# Altium footprint library SAMTEC THD.PcbLib: 161 footprints (part 1 of 12) (continued)
## SAMTEC_EHF-120-01-F-D-RA [mm] "40 Positions, Pitch 1.27mm, Double Row Throught Mount Right Angle Shrouded & Ejector IDC Header"
height 8.26
pads (40):
  rrect50% 1.05x1.05 hole 0.7: 1(-12.065,-0.635) 2(-12.065,0.635) 3(-10.795,-0.635) 4(-10.795,0.635) 5(-9.525,-0.635) 6(-9.525,0.635) 7(-8.255,-0.635) 8(-8.255,0.635) 9(-6.985,-0.635) 10(-6.985,0.635) 11(-5.715,-0.635) 12(-5.715,0.635) 13(-4.445,-0.635) 14(-4.445,0.635) 15(-3.175,-0.635) 16(-3.175,0.635) 17(-1.905,-0.635) 18(-1.905,0.635) 19(-0.635,-0.635) 20(-0.635,0.635) 21(0.635,-0.635) 22(0.635,0.635) 23(1.905,-0.635) 24(1.905,0.635) 25(3.175,-0.635) 26(3.175,0.635) 27(4.445,-0.635) 28(4.445,0.635) 29(5.715,-0.635) 30(5.715,0.635) 31(6.985,-0.635) 32(6.985,0.635) 33(8.255,-0.635) 34(8.255,0.635) 35(9.525,-0.635) 36(9.525,0.635) 37(10.795,-0.635) 38(10.795,0.635) 39(12.065,-0.635) 40(12.065,0.635)
Top Overlay:
  circle w0.3: c-13.231,-1.27 r0.15
  lines w0.2: -19.276,-7.708 -19.299,-7.749 ccw(c-18.64,-8.13) -19.356,-8.391 -17.773,-12.74 ccw(c-17.104,-12.497) -17.104,-13.208 -15.57,-13.208 -13.941,-11.579 ccw(c-14.3,-11.22) -13.792,-11.22 -13.792,-10.922 ccw(c-14.3,-10.922) -14.3,-10.414 -18.619,-10.414 ; -17.399,-1.905 -17.399,-5.029 -19.939,-5.029 ; -15.262,-10.16 -15.24,-10.414 ; -1.27,-2.286 -1.27,-5.029 1.27,-5.029 1.27,-2.286 ; 15.24,-10.414 15.262,-10.16 ; 17.399,-1.905 17.399,-5.029 19.939,-5.029 ; 18.619,-10.414 14.3,-10.414 ccw(c14.3,-10.922) 13.792,-10.922 13.792,-11.22 ccw(c14.3,-11.22) 13.941,-11.579 15.57,-13.208 17.104,-13.208 ccw(c17.104,-12.497) 17.773,-12.74 19.356,-8.391 ccw(c18.64,-8.13) 19.299,-7.749 18.919,-7.09 ; -19.939,-5.029 -19.939,-1.905 -12.827,-1.905 -12.827,-2.286 12.827,-2.286 12.827,-1.905 19.939,-1.905 19.939,-5.029 ; -19.939,-5.029 -18.669,-10.16 -15.24,-10.16 -15.24,-8.128 15.24,-8.128 15.24,-10.16 17.399,-10.16 19.939,-5.029
  text "40" at 13.075,0.229 h1.2
  text "2" at -13.97,0.203 h1.2
Mechanical 8:
  drawing of 164 lines, arcs and shapes, not listed
Mechanical 14:
  circle w0.3: c-13.231,-1.27 r0.15
  lines w0.1: -19.276,-7.708 -19.299,-7.749 ccw(c-18.64,-8.13) -19.356,-8.391 -17.773,-12.74 ccw(c-17.104,-12.497) -17.104,-13.208 -15.57,-13.208 -13.941,-11.579 ccw(c-14.3,-11.22) -13.792,-11.22 -13.792,-10.922 ccw(c-14.3,-10.922) -14.3,-10.414 -18.619,-10.414 ; -17.399,-1.905 -17.399,-5.029 -19.939,-5.029 ; -15.262,-10.16 -15.24,-10.414 ; -12.268,-2.286 -12.268,0.838 -11.862,0.838 -11.862,-2.286 ; -10.998,-2.286 -10.998,0.838 -10.592,0.838 -10.592,-2.286 ; -1.27,-2.286 -1.27,-5.029 1.27,-5.029 1.27,-2.286 ; 10.592,-2.286 10.592,0.838 10.998,0.838 10.998,-2.286 ; 11.862,-2.286 11.862,0.838 12.268,0.838 12.268,-2.286 ; 15.24,-10.414 15.262,-10.16 ; 17.399,-1.905 17.399,-5.029 19.939,-5.029 ; 18.619,-10.414 14.3,-10.414 ccw(c14.3,-10.922) 13.792,-10.922 13.792,-11.22 ccw(c14.3,-11.22) 13.941,-11.579 15.57,-13.208 17.104,-13.208 ccw(c17.104,-12.497) 17.773,-12.74 19.356,-8.391 ccw(c18.64,-8.13) 19.299,-7.749 18.919,-7.09 ; -19.939,-5.029 -19.939,-1.905 -12.827,-1.905 -12.827,-2.286 12.827,-2.286 12.827,-1.905 19.939,-1.905 19.939,-5.029 ; -19.939,-5.029 -18.669,-10.16 -15.24,-10.16 -15.24,-8.128 15.24,-8.128 15.24,-10.16 17.399,-10.16 19.939,-5.029
  text "40" at 13.075,0.229 h1.2
  text "2" at -13.97,0.203 h1.2
3D body "SAMTEC_EHF-120-01-F-D-RA.stp": height 6.68, standoff -2.29, extent -19.939,-13.208 19.939,0.838

## SAMTEC_ESQ-105-12-L-D [mm] "10 Contacts, Pitch 2.54mm - Top Entry, Dual Row, Through Mount Straigh Socket"
height 11.05
pads (10):
  round 1.7 hole 1: 1(-5.08,1.27) 2(-5.08,-1.27) 3(-2.54,1.27) 4(-2.54,-1.27) 5(0,1.27) 6(0,-1.27) 7(2.54,1.27) 8(2.54,-1.27) 9(5.08,1.27) 10(5.08,-1.27)
Top Overlay:
  circle w0.3: c-5.115,3.135 r0.15
  lines w0.2: -6.604,-2.477 -6.604,2.477 6.604,2.477 6.604,-2.477 -6.604,-2.477
  text "1" at -7.427,0.772 h1
Mechanical 8:
  lines w0.1: -5.58,-1.27 -5.08,-1.27 ; -5.58,1.27 -5.08,1.27 ; -5.08,-1.77 -5.08,-1.27 ; -5.08,-0.77 -5.08,-1.27 ; -5.08,0.77 -5.08,1.27 ; -5.08,1.77 -5.08,1.27 ; -4.58,-1.27 -5.08,-1.27 ; -4.58,1.27 -5.08,1.27 ; -3.04,-1.27 -2.54,-1.27 ; -3.04,1.27 -2.54,1.27 ; -2.54,-1.77 -2.54,-1.27 ; -2.54,-0.77 -2.54,-1.27 ; -2.54,0.77 -2.54,1.27 ; -2.54,1.77 -2.54,1.27 ; -2.04,-1.27 -2.54,-1.27 ; -2.04,1.27 -2.54,1.27 ; -0.5,-1.27 0,-1.27 ; -0.5,0 0,0 ; -0.5,1.27 0,1.27 ; 0,-1.77 0,-1.27 ; 0,-0.77 0,-1.27 ; 0,-0.5 0,0 ; 0,0.5 0,0 ; 0,0.77 0,1.27 ; 0,1.77 0,1.27 ; 0.5,-1.27 0,-1.27 ; 0.5,0 0,0 ; 0.5,1.27 0,1.27 ; 2.04,-1.27 2.54,-1.27 ; 2.04,1.27 2.54,1.27 ; 2.54,-1.77 2.54,-1.27 ; 2.54,-0.77 2.54,-1.27 ; 2.54,0.77 2.54,1.27 ; 2.54,1.77 2.54,1.27 ; 3.04,-1.27 2.54,-1.27 ; 3.04,1.27 2.54,1.27 ; 4.58,-1.27 5.08,-1.27 ; 4.58,1.27 5.08,1.27 ; 5.08,-1.77 5.08,-1.27 ; 5.08,-0.77 5.08,-1.27 ; 5.08,0.77 5.08,1.27 ; 5.08,1.77 5.08,1.27 ; 5.58,-1.27 5.08,-1.27 ; 5.58,1.27 5.08,1.27
Mechanical 14:
  circle w0.3: c-5.115,3.135 r0.15
  lines w0.1: -5.906,-2.095 -5.474,-1.664 ; -5.906,-2.095 -5.906,-0.445 ; -5.906,-2.095 -4.255,-2.095 ; -5.906,-0.445 -5.474,-0.876 ; -5.906,-0.445 -4.255,-0.445 ; -5.906,0.445 -5.474,0.876 ; -5.906,0.445 -5.906,2.095 ; -5.906,0.445 -4.255,0.445 ; -5.906,2.095 -5.474,1.664 ; -5.906,2.095 -4.255,2.095 ; -5.474,-1.664 -5.474,-0.876 ; -5.474,-1.664 -4.686,-1.664 ; -5.474,-0.876 -4.686,-0.876 ; -5.474,0.876 -5.474,1.664 ; -5.474,0.876 -4.686,0.876 ; -5.474,1.664 -4.686,1.664 ; -4.686,-1.664 -4.255,-2.095 ; -4.686,-1.664 -4.686,-0.876 ; -4.686,-0.876 -4.255,-0.445 ; -4.686,0.876 -4.255,0.445 ; -4.686,0.876 -4.686,1.664 ; -4.686,1.664 -4.255,2.095 ; -4.255,-2.095 -4.255,-0.445 ; -4.255,0.445 -4.255,2.095 ; -3.366,-2.095 -2.934,-1.664 ; -3.366,-2.095 -3.366,-0.445 ; -3.366,-2.095 -1.714,-2.095 ; -3.366,-0.445 -2.934,-0.876 ; -3.366,-0.445 -1.714,-0.445 ; -3.366,0.445 -2.934,0.876 ; -3.366,0.445 -3.366,2.095 ; -3.366,0.445 -1.714,0.445 ; -3.366,2.095 -2.934,1.664 ; -3.366,2.095 -1.714,2.095 ; -2.934,-1.664 -2.934,-0.876 ; -2.934,-1.664 -2.146,-1.664 ; -2.934,-0.876 -2.146,-0.876 ; -2.934,0.876 -2.934,1.664 ; -2.934,0.876 -2.146,0.876 ; -2.934,1.664 -2.146,1.664 ; -2.146,-1.664 -1.714,-2.095 ; -2.146,-1.664 -2.146,-0.876 ; -2.146,-0.876 -1.714,-0.445 ; -2.146,0.876 -1.714,0.445 ; -2.146,0.876 -2.146,1.664 ; -2.146,1.664 -1.714,2.095 ; -1.714,-2.095 -1.714,-0.445 ; -1.714,0.445 -1.714,2.095 ; -0.826,-2.095 -0.394,-1.664 ; -0.826,-2.095 -0.826,-0.445 ; -0.826,-2.095 0.826,-2.095 ; -0.826,-0.445 -0.394,-0.876 ; -0.826,-0.445 0.826,-0.445 ; -0.826,0.445 -0.394,0.876 ; -0.826,0.445 -0.826,2.095 ; -0.826,0.445 0.826,0.445 ; -0.826,2.095 -0.394,1.664 ; -0.826,2.095 0.826,2.095 ; -0.394,-1.664 -0.394,-0.876 ; -0.394,-1.664 0.394,-1.664 ; -0.394,-0.876 0.394,-0.876 ; -0.394,0.876 -0.394,1.664 ; -0.394,0.876 0.394,0.876 ; -0.394,1.664 0.394,1.664 ; 0.394,-1.664 0.826,-2.095 ; 0.394,-1.664 0.394,-0.876 ; 0.394,-0.876 0.826,-0.445 ; 0.394,0.876 0.826,0.445 ; 0.394,0.876 0.394,1.664 ; 0.394,1.664 0.826,2.095 ; 0.826,-2.095 0.826,-0.445 ; 0.826,0.445 0.826,2.095 ; 1.714,-2.095 2.146,-1.664 ; 1.714,-2.095 1.714,-0.445 ; 1.714,-2.095 3.366,-2.095 ; 1.714,-0.445 2.146,-0.876 ; 1.714,-0.445 3.366,-0.445 ; 1.714,0.445 2.146,0.876 ; 1.714,0.445 1.714,2.095 ; 1.714,0.445 3.366,0.445 ; 1.714,2.095 2.146,1.664 ; 1.714,2.095 3.366,2.095 ; 2.146,-1.664 2.146,-0.876 ; 2.146,-1.664 2.934,-1.664 ; 2.146,-0.876 2.934,-0.876 ; 2.146,0.876 2.146,1.664 ; 2.146,0.876 2.934,0.876 ; 2.146,1.664 2.934,1.664 ; 2.934,-1.664 3.366,-2.095 ; 2.934,-1.664 2.934,-0.876 ; 2.934,-0.876 3.366,-0.445 ; 2.934,0.876 3.366,0.445 ; 2.934,0.876 2.934,1.664 ; 2.934,1.664 3.366,2.095 ; 3.366,-2.095 3.366,-0.445 ; 3.366,0.445 3.366,2.095 ; 4.255,-2.095 4.686,-1.664 ; 4.255,-2.095 4.255,-0.445 ; 4.255,-2.095 5.906,-2.095 ; 4.255,-0.445 4.686,-0.876 ; 4.255,-0.445 5.906,-0.445 ; 4.255,0.445 4.686,0.876 ; 4.255,0.445 4.255,2.095 ; 4.255,0.445 5.906,0.445 ; 4.255,2.095 4.686,1.664 ; 4.255,2.095 5.906,2.095 ; 4.686,-1.664 4.686,-0.876 ; 4.686,-1.664 5.474,-1.664 ; 4.686,-0.876 5.474,-0.876 ; 4.686,0.876 4.686,1.664 ; 4.686,0.876 5.474,0.876 ; 4.686,1.664 5.474,1.664 ; 5.474,-1.664 5.906,-2.095 ; 5.474,-1.664 5.474,-0.876 ; 5.474,-0.876 5.906,-0.445 ; 5.474,0.876 5.906,0.445 ; 5.474,0.876 5.474,1.664 ; 5.474,1.664 5.906,2.095 ; 5.906,-2.095 5.906,-0.445 ; 5.906,0.445 5.906,2.095 ; -6.604,-2.477 -6.604,2.477 6.604,2.477 6.604,-2.477 -6.604,-2.477
  text "1" at -7.427,0.772 h1
3D body "SAMTEC_ESQ-105-12-L-D.stp": height 11.05, standoff -2.29, extent -6.604,-2.54 6.604,2.54

## SAMTEC_ESQ-110-12-L-D [mm] "20 Contacts, Pitch 2.54mm - Top Entry, Dual Row, Through Mount Straigh Socket"
height 11.05
pads (20):
  round 1.7 hole 1: 1(-11.43,1.27) 2(-11.43,-1.27) 3(-8.89,1.27) 4(-8.89,-1.27) 5(-6.35,1.27) 6(-6.35,-1.27) 7(-3.81,1.27) 8(-3.81,-1.27) 9(-1.27,1.27) 10(-1.27,-1.27) 11(1.27,1.27) 12(1.27,-1.27) 13(3.81,1.27) 14(3.81,-1.27) 15(6.35,1.27) 16(6.35,-1.27) 17(8.89,1.27) 18(8.89,-1.27) 19(11.43,1.27) 20(11.43,-1.27)
Top Overlay:
  circle w0.3: c-11.465,3.135 r0.15
  lines w0.2: -12.954,-2.476 12.954,-2.476 12.954,2.476 -12.954,2.476 -12.954,-2.476
  text "1" at -13.777,0.772 h1
Mechanical 8:
  lines w0.05: -11.93,-1.27 -11.43,-1.27 ; -11.93,1.27 -11.43,1.27 ; -11.43,-1.77 -11.43,-1.27 ; -11.43,-0.77 -11.43,-1.27 ; -11.43,0.77 -11.43,1.27 ; -11.43,1.77 -11.43,1.27 ; -10.93,-1.27 -11.43,-1.27 ; -10.93,1.27 -11.43,1.27 ; -9.39,-1.27 -8.89,-1.27 ; -9.39,1.27 -8.89,1.27 ; -8.89,-1.77 -8.89,-1.27 ; -8.89,-0.77 -8.89,-1.27 ; -8.89,0.77 -8.89,1.27 ; -8.89,1.77 -8.89,1.27 ; -8.39,-1.27 -8.89,-1.27 ; -8.39,1.27 -8.89,1.27 ; -6.85,-1.27 -6.35,-1.27 ; -6.85,1.27 -6.35,1.27 ; -6.35,-1.77 -6.35,-1.27 ; -6.35,-0.77 -6.35,-1.27 ; -6.35,0.77 -6.35,1.27 ; -6.35,1.77 -6.35,1.27 ; -5.85,-1.27 -6.35,-1.27 ; -5.85,1.27 -6.35,1.27 ; -4.31,-1.27 -3.81,-1.27 ; -4.31,1.27 -3.81,1.27 ; -3.81,-1.77 -3.81,-1.27 ; -3.81,-0.77 -3.81,-1.27 ; -3.81,0.77 -3.81,1.27 ; -3.81,1.77 -3.81,1.27 ; -3.31,-1.27 -3.81,-1.27 ; -3.31,1.27 -3.81,1.27 ; -1.77,-1.27 -1.27,-1.27 ; -1.77,1.27 -1.27,1.27 ; -1.27,-1.77 -1.27,-1.27 ; -1.27,-0.77 -1.27,-1.27 ; -1.27,0.77 -1.27,1.27 ; -1.27,1.77 -1.27,1.27 ; -0.77,-1.27 -1.27,-1.27 ; -0.77,1.27 -1.27,1.27 ; -0.5,0 0,0 ; 0,-0.5 0,0 ; 0,0.5 0,0 ; 0.5,0 0,0 ; 0.77,-1.27 1.27,-1.27 ; 0.77,1.27 1.27,1.27 ; 1.27,-1.77 1.27,-1.27 ; 1.27,-0.77 1.27,-1.27 ; 1.27,0.77 1.27,1.27 ; 1.27,1.77 1.27,1.27 ; 1.77,-1.27 1.27,-1.27 ; 1.77,1.27 1.27,1.27 ; 3.31,-1.27 3.81,-1.27 ; 3.31,1.27 3.81,1.27 ; 3.81,-1.77 3.81,-1.27 ; 3.81,-0.77 3.81,-1.27 ; 3.81,0.77 3.81,1.27 ; 3.81,1.77 3.81,1.27 ; 4.31,-1.27 3.81,-1.27 ; 4.31,1.27 3.81,1.27 ; 5.85,-1.27 6.35,-1.27 ; 5.85,1.27 6.35,1.27 ; 6.35,-1.77 6.35,-1.27 ; 6.35,-0.77 6.35,-1.27 ; 6.35,0.77 6.35,1.27 ; 6.35,1.77 6.35,1.27 ; 6.85,-1.27 6.35,-1.27 ; 6.85,1.27 6.35,1.27 ; 8.39,-1.27 8.89,-1.27 ; 8.39,1.27 8.89,1.27 ; 8.89,-1.77 8.89,-1.27 ; 8.89,-0.77 8.89,-1.27 ; 8.89,0.77 8.89,1.27 ; 8.89,1.77 8.89,1.27 ; 9.39,-1.27 8.89,-1.27 ; 9.39,1.27 8.89,1.27 ; 10.93,-1.27 11.43,-1.27 ; 10.93,1.27 11.43,1.27 ; 11.43,-1.77 11.43,-1.27 ; 11.43,-0.77 11.43,-1.27 ; 11.43,0.77 11.43,1.27 ; 11.43,1.77 11.43,1.27 ; 11.93,-1.27 11.43,-1.27 ; 11.93,1.27 11.43,1.27
Mechanical 14:
  circle w0.3: c-11.465,3.135 r0.15
  lines w0.1: -12.954,-2.476 12.954,-2.476 12.954,2.476 -12.954,2.476 -12.954,-2.476 ; -11.811,-1.651 -11.811,-0.889 -11.049,-0.889 -11.049,-1.651 -11.811,-1.651 ; -11.811,0.889 -11.811,1.651 -11.049,1.651 -11.049,0.889 -11.811,0.889 ; -9.271,-1.651 -9.271,-0.889 -8.509,-0.889 -8.509,-1.651 -9.271,-1.651 ; -9.271,0.889 -9.271,1.651 -8.509,1.651 -8.509,0.889 -9.271,0.889 ; -6.731,-1.651 -6.731,-0.889 -5.969,-0.889 -5.969,-1.651 -6.731,-1.651 ; -6.731,0.889 -6.731,1.651 -5.969,1.651 -5.969,0.889 -6.731,0.889 ; -4.191,-1.651 -4.191,-0.889 -3.429,-0.889 -3.429,-1.651 -4.191,-1.651 ; -4.191,0.889 -4.191,1.651 -3.429,1.651 -3.429,0.889 -4.191,0.889 ; -1.651,-1.651 -1.651,-0.889 -0.889,-0.889 -0.889,-1.651 -1.651,-1.651 ; -1.651,0.889 -1.651,1.651 -0.889,1.651 -0.889,0.889 -1.651,0.889 ; 0.889,-1.651 0.889,-0.889 1.651,-0.889 1.651,-1.651 0.889,-1.651 ; 0.889,0.889 0.889,1.651 1.651,1.651 1.651,0.889 0.889,0.889 ; 3.429,-1.651 3.429,-0.889 4.191,-0.889 4.191,-1.651 3.429,-1.651 ; 3.429,0.889 3.429,1.651 4.191,1.651 4.191,0.889 3.429,0.889 ; 5.969,-1.651 5.969,-0.889 6.731,-0.889 6.731,-1.651 5.969,-1.651 ; 5.969,0.889 5.969,1.651 6.731,1.651 6.731,0.889 5.969,0.889 ; 8.509,-1.651 8.509,-0.889 9.271,-0.889 9.271,-1.651 8.509,-1.651 ; 8.509,0.889 8.509,1.651 9.271,1.651 9.271,0.889 8.509,0.889 ; 11.049,-1.651 11.049,-0.889 11.811,-0.889 11.811,-1.651 11.049,-1.651 ; 11.049,0.889 11.049,1.651 11.811,1.651 11.811,0.889 11.049,0.889
  text "1" at -13.777,0.772 h1
3D body "SAMTEC_ESQ-110-12-L-D.stp": height 11.05, standoff -2.29, extent -12.954,-2.54 12.954,2.54

## SAMTEC_ESS-115-T-04 [mm] "15 Contacts - Pitch 2.54mm - Single Row Vertical Entry Precision Machined Socket Strip"
height 10.92
pads (15):
  rect 1.8x1.8 hole 1.1: 1(0,0)
  round 1.8 hole 1.1: 2(2.54,0) 3(5.08,0) 4(7.62,0) 5(10.16,0) 6(12.7,0) 7(15.24,0) 8(17.78,0) 9(20.32,0) 10(22.86,0) 11(25.4,0) 12(27.94,0) 13(30.48,0) 14(33.02,0) 15(35.56,0)
Top Overlay:
  circle w0.3: c-0.037,1.838 r0.15
  lines w0.2: -1.27,-1.27 36.83,-1.27 36.83,1.27 -1.27,1.27 -1.27,-1.27
Mechanical 8:
  lines w0.1: -0.5,0 0,0 ; 0,-0.5 0,0 ; 0,0.5 0,0 ; 0.5,0 0,0 ; 2.04,0 2.54,0 ; 2.54,-0.5 2.54,0 ; 2.54,0.5 2.54,0 ; 3.04,0 2.54,0 ; 4.58,0 5.08,0 ; 5.08,-0.5 5.08,0 ; 5.08,0.5 5.08,0 ; 5.58,0 5.08,0 ; 7.12,0 7.62,0 ; 7.62,-0.5 7.62,0 ; 7.62,0.5 7.62,0 ; 8.12,0 7.62,0 ; 9.66,0 10.16,0 ; 10.16,-0.5 10.16,0 ; 10.16,0.5 10.16,0 ; 10.66,0 10.16,0 ; 12.2,0 12.7,0 ; 12.7,-0.5 12.7,0 ; 12.7,0.5 12.7,0 ; 13.2,0 12.7,0 ; 14.74,0 15.24,0 ; 15.24,-0.5 15.24,0 ; 15.24,0.5 15.24,0 ; 15.74,0 15.24,0 ; 17.28,0 17.78,0 ; 17.78,-0.5 17.78,0 ; 17.78,0.5 17.78,0 ; 18.28,0 17.78,0 ; 19.82,0 20.32,0 ; 20.32,-0.5 20.32,0 ; 20.32,0.5 20.32,0 ; 20.82,0 20.32,0 ; 22.36,0 22.86,0 ; 22.86,-0.5 22.86,0 ; 22.86,0.5 22.86,0 ; 23.36,0 22.86,0 ; 24.9,0 25.4,0 ; 25.4,-0.5 25.4,0 ; 25.4,0.5 25.4,0 ; 25.9,0 25.4,0 ; 27.44,0 27.94,0 ; 27.94,-0.5 27.94,0 ; 27.94,0.5 27.94,0 ; 28.44,0 27.94,0 ; 29.98,0 30.48,0 ; 30.48,-0.5 30.48,0 ; 30.48,0.5 30.48,0 ; 30.98,0 30.48,0 ; 32.52,0 33.02,0 ; 33.02,-0.5 33.02,0 ; 33.02,0.5 33.02,0 ; 33.52,0 33.02,0 ; 35.06,0 35.56,0 ; 35.56,-0.5 35.56,0 ; 35.56,0.5 35.56,0 ; 36.06,0 35.56,0
Mechanical 14:
  circle w0.1: c0,0 r0.914
  circle w0.1: c2.54,0 r0.914
  circle w0.1: c5.08,0 r0.914
  circle w0.1: c7.62,0 r0.914
  circle w0.1: c10.16,0 r0.914
  circle w0.1: c12.7,0 r0.914
  circle w0.1: c15.24,0 r0.914
  circle w0.1: c17.78,0 r0.914
  circle w0.1: c20.32,0 r0.914
  circle w0.1: c22.86,0 r0.914
  circle w0.1: c25.4,0 r0.914
  circle w0.1: c27.94,0 r0.914
  circle w0.1: c30.48,0 r0.914
  circle w0.1: c33.02,0 r0.914
  circle w0.1: c35.56,0 r0.914
  circle w0.3: c-0.037,1.838 r0.15
  lines w0.1: -1.27,-1.27 -1.27,-0.635 -1.143,-0.635 -1.143,0.635 -1.27,0.635 -1.27,1.27 0.889,1.27 1.143,0.635 1.397,0.635 1.651,1.27 3.429,1.27 3.683,0.635 3.937,0.635 4.191,1.27 5.969,1.27 6.223,0.635 6.477,0.635 6.731,1.27 8.509,1.27 8.763,0.635 9.017,0.635 9.271,1.27 11.049,1.27 11.303,0.635 11.557,0.635 11.811,1.27 13.589,1.27 13.843,0.635 14.097,0.635 14.351,1.27 16.129,1.27 16.383,0.635 16.637,0.635 16.891,1.27 18.669,1.27 18.923,0.635 19.177,0.635 19.431,1.27 21.209,1.27 21.463,0.635 21.717,0.635 21.971,1.27 23.749,1.27 24.003,0.635 24.257,0.635 24.511,1.27 26.289,1.27 26.543,0.635 26.797,0.635 27.051,1.27 28.829,1.27 29.083,0.635 29.337,0.635 29.591,1.27 31.369,1.27 31.623,0.635 31.877,0.635 32.131,1.27 33.909,1.27 34.163,0.635 34.417,0.635 34.671,1.27 36.83,1.27 36.83,-1.27 34.671,-1.27 34.417,-0.635 34.163,-0.635 33.909,-1.27 32.131,-1.27 31.877,-0.635 31.623,-0.635 31.369,-1.27 29.591,-1.27 29.337,-0.635 29.083,-0.635 28.829,-1.27 27.051,-1.27 26.797,-0.635 26.543,-0.635 26.289,-1.27 24.511,-1.27 24.257,-0.635 24.003,-0.635 23.749,-1.27 21.971,-1.27 21.717,-0.635 21.463,-0.635 21.209,-1.27 19.431,-1.27 19.177,-0.635 18.923,-0.635 18.669,-1.27 16.891,-1.27 16.637,-0.635 16.383,-0.635 16.129,-1.27 14.351,-1.27 14.097,-0.635 13.843,-0.635 13.589,-1.27 11.811,-1.27 11.557,-0.635 11.303,-0.635 11.049,-1.27 9.271,-1.27 9.017,-0.635 8.763,-0.635 8.509,-1.27 6.731,-1.27 6.477,-0.635 6.223,-0.635 5.969,-1.27 4.191,-1.27 3.937,-0.635 3.683,-0.635 3.429,-1.27 1.651,-1.27 1.397,-0.635 1.143,-0.635 0.889,-1.27 -1.27,-1.27
3D body "SAMTEC_ESS-115-T-04.stp": height 10.92, standoff -3.12, extent -1.27,-1.27 36.83,1.27

## SAMTEC_ESW-106-69-L-D [mm] "12 Contacts, Pitch 2.54mm, Dual Row Through Mount Straight Elevated Socket, Low Insertion Force (Lead Length 4.57mm)"
height 18.67
pads (12):
  round 1.9 hole 1.2: 1(-6.35,1.27) 2(-6.35,-1.27) 3(-3.81,1.27) 4(-3.81,-1.27) 5(-1.27,1.27) 6(-1.27,-1.27) 7(1.27,1.27) 8(1.27,-1.27) 9(3.81,1.27) 10(3.81,-1.27) 11(6.35,1.27) 12(6.35,-1.27)
Top Overlay:
  circle w0.3: c-6.385,3.135 r0.15
  lines w0.2: -6.834,-2.476 -7.874,-2.476 -7.874,2.476 -6.834,2.476 ; -5.866,-2.476 -4.294,-2.476 ; -5.866,2.476 -4.294,2.476 ; -3.326,-2.476 -1.754,-2.476 ; -3.326,2.476 -1.754,2.476 ; -0.786,-2.476 0.786,-2.476 ; -0.786,2.476 0.786,2.476 ; 1.754,-2.476 3.326,-2.476 ; 1.754,2.476 3.326,2.476 ; 4.294,-2.476 5.866,-2.476 ; 4.294,2.476 5.866,2.476 ; 6.834,-2.476 7.874,-2.476 7.874,2.476 6.834,2.476
  text "12" at 8.355,-1.925 h1.2
  text "1" at -8.697,0.772 h1.2
Mechanical 8:
  lines w0.05: -6.85,-1.27 -6.35,-1.27 ; -6.85,1.27 -6.35,1.27 ; -6.35,-1.77 -6.35,-1.27 ; -6.35,-0.77 -6.35,-1.27 ; -6.35,0.77 -6.35,1.27 ; -6.35,1.77 -6.35,1.27 ; -5.85,-1.27 -6.35,-1.27 ; -5.85,1.27 -6.35,1.27 ; -4.31,-1.27 -3.81,-1.27 ; -4.31,1.27 -3.81,1.27 ; -3.81,-1.77 -3.81,-1.27 ; -3.81,-0.77 -3.81,-1.27 ; -3.81,0.77 -3.81,1.27 ; -3.81,1.77 -3.81,1.27 ; -3.31,-1.27 -3.81,-1.27 ; -3.31,1.27 -3.81,1.27 ; -1.77,-1.27 -1.27,-1.27 ; -1.77,1.27 -1.27,1.27 ; -1.27,-1.77 -1.27,-1.27 ; -1.27,-0.77 -1.27,-1.27 ; -1.27,0.77 -1.27,1.27 ; -1.27,1.77 -1.27,1.27 ; -0.77,-1.27 -1.27,-1.27 ; -0.77,1.27 -1.27,1.27 ; -0.5,0 0,0 ; 0,-0.5 0,0 ; 0,0.5 0,0 ; 0.5,0 0,0 ; 0.77,-1.27 1.27,-1.27 ; 0.77,1.27 1.27,1.27 ; 1.27,-1.77 1.27,-1.27 ; 1.27,-0.77 1.27,-1.27 ; 1.27,0.77 1.27,1.27 ; 1.27,1.77 1.27,1.27 ; 1.77,-1.27 1.27,-1.27 ; 1.77,1.27 1.27,1.27 ; 3.31,-1.27 3.81,-1.27 ; 3.31,1.27 3.81,1.27 ; 3.81,-1.77 3.81,-1.27 ; 3.81,-0.77 3.81,-1.27 ; 3.81,0.77 3.81,1.27 ; 3.81,1.77 3.81,1.27 ; 4.31,-1.27 3.81,-1.27 ; 4.31,1.27 3.81,1.27 ; 5.85,-1.27 6.35,-1.27 ; 5.85,1.27 6.35,1.27 ; 6.35,-1.77 6.35,-1.27 ; 6.35,-0.77 6.35,-1.27 ; 6.35,0.77 6.35,1.27 ; 6.35,1.77 6.35,1.27 ; 6.85,-1.27 6.35,-1.27 ; 6.85,1.27 6.35,1.27
Mechanical 14:
  circle w0.3: c-6.385,3.135 r0.15
  lines w0.1: -7.874,-2.476 -7.874,2.476 7.874,2.476 7.874,-2.476 -7.874,-2.476 ; -6.731,-1.651 -5.969,-1.651 -5.969,-0.889 -6.731,-0.889 -6.731,-1.651 ; -6.731,0.889 -5.969,0.889 -5.969,1.651 -6.731,1.651 -6.731,0.889 ; -4.191,-1.651 -3.429,-1.651 -3.429,-0.889 -4.191,-0.889 -4.191,-1.651 ; -4.191,0.889 -3.429,0.889 -3.429,1.651 -4.191,1.651 -4.191,0.889 ; -1.651,-1.651 -0.889,-1.651 -0.889,-0.889 -1.651,-0.889 -1.651,-1.651 ; -1.651,0.889 -0.889,0.889 -0.889,1.651 -1.651,1.651 -1.651,0.889 ; 0.889,-1.651 1.651,-1.651 1.651,-0.889 0.889,-0.889 0.889,-1.651 ; 0.889,0.889 1.651,0.889 1.651,1.651 0.889,1.651 0.889,0.889 ; 3.429,-1.651 4.191,-1.651 4.191,-0.889 3.429,-0.889 3.429,-1.651 ; 3.429,0.889 4.191,0.889 4.191,1.651 3.429,1.651 3.429,0.889 ; 5.969,-1.651 6.731,-1.651 6.731,-0.889 5.969,-0.889 5.969,-1.651 ; 5.969,0.889 6.731,0.889 6.731,1.651 5.969,1.651 5.969,0.889
  text "12" at 8.355,-1.925 h1.2
  text "1" at -8.697,0.772 h1.2
3D body "SAMTEC_ESW-106-69-L-D.stp": height 18.67, standoff -4.57, extent -7.874,-2.54 7.874,2.54

## SAMTEC_ESW-116-69-L-D [mm] "32 Contacts, Pitch 2.54mm, Dual Row Through Mount Straight Elevated Socket, Low Insertion Force (Lead Length 4.57mm)"
height 18.67
pads (32):
  round 1.9 hole 1.2: 1(-19.05,1.27) 2(-19.05,-1.27) 3(-16.51,1.27) 4(-16.51,-1.27) 5(-13.97,1.27) 6(-13.97,-1.27) 7(-11.43,1.27) 8(-11.43,-1.27) 9(-8.89,1.27) 10(-8.89,-1.27) 11(-6.35,1.27) 12(-6.35,-1.27) 13(-3.81,1.27) 14(-3.81,-1.27) 15(-1.27,1.27) 16(-1.27,-1.27) 17(1.27,1.27) 18(1.27,-1.27) 19(3.81,1.27) 20(3.81,-1.27) 21(6.35,1.27) 22(6.35,-1.27) 23(8.89,1.27) 24(8.89,-1.27) 25(11.43,1.27) 26(11.43,-1.27) 27(13.97,1.27) 28(13.97,-1.27) 29(16.51,1.27) 30(16.51,-1.27) 31(19.05,1.27) 32(19.05,-1.27)
Top Overlay:
  circle w0.3: c-19.085,3.135 r0.15
  lines w0.2: -19.534,-2.476 -20.574,-2.476 -20.574,2.476 -19.534,2.476 ; -18.566,-2.476 -16.994,-2.476 ; -18.566,2.476 -16.994,2.476 ; -16.026,-2.476 -14.454,-2.476 ; -16.026,2.476 -14.454,2.476 ; -13.486,-2.476 -11.914,-2.476 ; -13.486,2.476 -11.914,2.476 ; -10.946,-2.476 -9.374,-2.476 ; -10.946,2.476 -9.374,2.476 ; -8.406,-2.476 -6.834,-2.476 ; -8.406,2.476 -6.834,2.476 ; -5.866,-2.476 -4.294,-2.476 ; -5.866,2.476 -4.294,2.476 ; -3.326,-2.476 -1.754,-2.476 ; -3.326,2.476 -1.754,2.476 ; -0.786,-2.476 0.786,-2.476 ; -0.786,2.476 0.786,2.476 ; 1.754,-2.476 3.326,-2.476 ; 1.754,2.476 3.326,2.476 ; 4.294,-2.476 5.866,-2.476 ; 4.294,2.476 5.866,2.476 ; 6.834,-2.476 8.406,-2.476 ; 6.834,2.476 8.406,2.476 ; 9.374,-2.476 10.946,-2.476 ; 9.374,2.476 10.946,2.476 ; 11.914,-2.476 13.486,-2.476 ; 11.914,2.476 13.486,2.476 ; 14.454,-2.476 16.026,-2.476 ; 14.454,2.476 16.026,2.476 ; 16.994,-2.476 18.566,-2.476 ; 16.994,2.476 18.566,2.476 ; 19.534,-2.476 20.574,-2.476 20.574,2.476 19.534,2.476
  text "1" at -21.397,0.772 h1.2
  text "32" at 21.055,-1.925 h1.2
Mechanical 8:
  lines w0.05: -19.55,-1.27 -19.05,-1.27 ; -19.55,1.27 -19.05,1.27 ; -19.05,-1.77 -19.05,-1.27 ; -19.05,-0.77 -19.05,-1.27 ; -19.05,0.77 -19.05,1.27 ; -19.05,1.77 -19.05,1.27 ; -18.55,-1.27 -19.05,-1.27 ; -18.55,1.27 -19.05,1.27 ; -17.01,-1.27 -16.51,-1.27 ; -17.01,1.27 -16.51,1.27 ; -16.51,-1.77 -16.51,-1.27 ; -16.51,-0.77 -16.51,-1.27 ; -16.51,0.77 -16.51,1.27 ; -16.51,1.77 -16.51,1.27 ; -16.01,-1.27 -16.51,-1.27 ; -16.01,1.27 -16.51,1.27 ; -14.47,-1.27 -13.97,-1.27 ; -14.47,1.27 -13.97,1.27 ; -13.97,-1.77 -13.97,-1.27 ; -13.97,-0.77 -13.97,-1.27 ; -13.97,0.77 -13.97,1.27 ; -13.97,1.77 -13.97,1.27 ; -13.47,-1.27 -13.97,-1.27 ; -13.47,1.27 -13.97,1.27 ; -11.93,-1.27 -11.43,-1.27 ; -11.93,1.27 -11.43,1.27 ; -11.43,-1.77 -11.43,-1.27 ; -11.43,-0.77 -11.43,-1.27 ; -11.43,0.77 -11.43,1.27 ; -11.43,1.77 -11.43,1.27 ; -10.93,-1.27 -11.43,-1.27 ; -10.93,1.27 -11.43,1.27 ; -9.39,-1.27 -8.89,-1.27 ; -9.39,1.27 -8.89,1.27 ; -8.89,-1.77 -8.89,-1.27 ; -8.89,-0.77 -8.89,-1.27 ; -8.89,0.77 -8.89,1.27 ; -8.89,1.77 -8.89,1.27 ; -8.39,-1.27 -8.89,-1.27 ; -8.39,1.27 -8.89,1.27 ; -6.85,-1.27 -6.35,-1.27 ; -6.85,1.27 -6.35,1.27 ; -6.35,-1.77 -6.35,-1.27 ; -6.35,-0.77 -6.35,-1.27 ; -6.35,0.77 -6.35,1.27 ; -6.35,1.77 -6.35,1.27 ; -5.85,-1.27 -6.35,-1.27 ; -5.85,1.27 -6.35,1.27 ; -4.31,-1.27 -3.81,-1.27 ; -4.31,1.27 -3.81,1.27 ; -3.81,-1.77 -3.81,-1.27 ; -3.81,-0.77 -3.81,-1.27 ; -3.81,0.77 -3.81,1.27 ; -3.81,1.77 -3.81,1.27 ; -3.31,-1.27 -3.81,-1.27 ; -3.31,1.27 -3.81,1.27 ; -1.77,-1.27 -1.27,-1.27 ; -1.77,1.27 -1.27,1.27 ; -1.27,-1.77 -1.27,-1.27 ; -1.27,-0.77 -1.27,-1.27 ; -1.27,0.77 -1.27,1.27 ; -1.27,1.77 -1.27,1.27 ; -0.77,-1.27 -1.27,-1.27 ; -0.77,1.27 -1.27,1.27 ; -0.5,0 0,0 ; 0,-0.5 0,0 ; 0,0.5 0,0 ; 0.5,0 0,0 ; 0.77,-1.27 1.27,-1.27 ; 0.77,1.27 1.27,1.27 ; 1.27,-1.77 1.27,-1.27 ; 1.27,-0.77 1.27,-1.27 ; 1.27,0.77 1.27,1.27 ; 1.27,1.77 1.27,1.27 ; 1.77,-1.27 1.27,-1.27 ; 1.77,1.27 1.27,1.27 ; 3.31,-1.27 3.81,-1.27 ; 3.31,1.27 3.81,1.27 ; 3.81,-1.77 3.81,-1.27 ; 3.81,-0.77 3.81,-1.27 ; 3.81,0.77 3.81,1.27 ; 3.81,1.77 3.81,1.27 ; 4.31,-1.27 3.81,-1.27 ; 4.31,1.27 3.81,1.27 ; 5.85,-1.27 6.35,-1.27 ; 5.85,1.27 6.35,1.27 ; 6.35,-1.77 6.35,-1.27 ; 6.35,-0.77 6.35,-1.27 ; 6.35,0.77 6.35,1.27 ; 6.35,1.77 6.35,1.27 ; 6.85,-1.27 6.35,-1.27 ; 6.85,1.27 6.35,1.27 ; 8.39,-1.27 8.89,-1.27 ; 8.39,1.27 8.89,1.27 ; 8.89,-1.77 8.89,-1.27 ; 8.89,-0.77 8.89,-1.27 ; 8.89,0.77 8.89,1.27 ; 8.89,1.77 8.89,1.27 ; 9.39,-1.27 8.89,-1.27 ; 9.39,1.27 8.89,1.27 ; 10.93,-1.27 11.43,-1.27 ; 10.93,1.27 11.43,1.27 ; 11.43,-1.77 11.43,-1.27 ; 11.43,-0.77 11.43,-1.27 ; 11.43,0.77 11.43,1.27 ; 11.43,1.77 11.43,1.27 ; 11.93,-1.27 11.43,-1.27 ; 11.93,1.27 11.43,1.27 ; 13.47,-1.27 13.97,-1.27 ; 13.47,1.27 13.97,1.27 ; 13.97,-1.77 13.97,-1.27 ; 13.97,-0.77 13.97,-1.27 ; 13.97,0.77 13.97,1.27 ; 13.97,1.77 13.97,1.27 ; 14.47,-1.27 13.97,-1.27 ; 14.47,1.27 13.97,1.27 ; 16.01,-1.27 16.51,-1.27 ; 16.01,1.27 16.51,1.27 ; 16.51,-1.77 16.51,-1.27 ; 16.51,-0.77 16.51,-1.27 ; 16.51,0.77 16.51,1.27 ; 16.51,1.77 16.51,1.27 ; 17.01,-1.27 16.51,-1.27 ; 17.01,1.27 16.51,1.27 ; 18.55,-1.27 19.05,-1.27 ; 18.55,1.27 19.05,1.27 ; 19.05,-1.77 19.05,-1.27 ; 19.05,-0.77 19.05,-1.27 ; 19.05,0.77 19.05,1.27 ; 19.05,1.77 19.05,1.27 ; 19.55,-1.27 19.05,-1.27 ; 19.55,1.27 19.05,1.27
Mechanical 14:
  circle w0.3: c-19.085,3.135 r0.15
  lines w0.1: -20.574,-2.476 20.574,-2.476 20.574,2.476 -20.574,2.476 -20.574,-2.476 ; -19.431,-1.651 -19.431,-0.889 -18.669,-0.889 -18.669,-1.651 -19.431,-1.651 ; -19.431,0.889 -19.431,1.651 -18.669,1.651 -18.669,0.889 -19.431,0.889 ; -16.891,-1.651 -16.891,-0.889 -16.129,-0.889 -16.129,-1.651 -16.891,-1.651 ; -16.891,0.889 -16.891,1.651 -16.129,1.651 -16.129,0.889 -16.891,0.889 ; -14.351,-1.651 -14.351,-0.889 -13.589,-0.889 -13.589,-1.651 -14.351,-1.651 ; -14.351,0.889 -14.351,1.651 -13.589,1.651 -13.589,0.889 -14.351,0.889 ; -11.811,-1.651 -11.811,-0.889 -11.049,-0.889 -11.049,-1.651 -11.811,-1.651 ; -11.811,0.889 -11.811,1.651 -11.049,1.651 -11.049,0.889 -11.811,0.889 ; -9.271,-1.651 -9.271,-0.889 -8.509,-0.889 -8.509,-1.651 -9.271,-1.651 ; -9.271,0.889 -9.271,1.651 -8.509,1.651 -8.509,0.889 -9.271,0.889 ; -6.731,-1.651 -6.731,-0.889 -5.969,-0.889 -5.969,-1.651 -6.731,-1.651 ; -6.731,0.889 -6.731,1.651 -5.969,1.651 -5.969,0.889 -6.731,0.889 ; -4.191,-1.651 -3.429,-1.651 -3.429,-0.889 -4.191,-0.889 -4.191,-1.651 ; -4.191,0.889 -3.429,0.889 -3.429,1.651 -4.191,1.651 -4.191,0.889 ; -1.651,-1.651 -0.889,-1.651 -0.889,-0.889 -1.651,-0.889 -1.651,-1.651 ; -1.651,0.889 -0.889,0.889 -0.889,1.651 -1.651,1.651 -1.651,0.889 ; 0.889,-1.651 1.651,-1.651 1.651,-0.889 0.889,-0.889 0.889,-1.651 ; 0.889,0.889 1.651,0.889 1.651,1.651 0.889,1.651 0.889,0.889 ; 3.429,-1.651 4.191,-1.651 4.191,-0.889 3.429,-0.889 3.429,-1.651 ; 3.429,0.889 4.191,0.889 4.191,1.651 3.429,1.651 3.429,0.889 ; 5.969,-1.651 6.731,-1.651 6.731,-0.889 5.969,-0.889 5.969,-1.651 ; 5.969,0.889 6.731,0.889 6.731,1.651 5.969,1.651 5.969,0.889 ; 8.509,-1.651 9.271,-1.651 9.271,-0.889 8.509,-0.889 8.509,-1.651 ; 8.509,0.889 9.271,0.889 9.271,1.651 8.509,1.651 8.509,0.889 ; 11.049,-1.651 11.811,-1.651 11.811,-0.889 11.049,-0.889 11.049,-1.651 ; 11.049,0.889 11.811,0.889 11.811,1.651 11.049,1.651 11.049,0.889 ; 13.589,-1.651 14.351,-1.651 14.351,-0.889 13.589,-0.889 13.589,-1.651 ; 13.589,0.889 14.351,0.889 14.351,1.651 13.589,1.651 13.589,0.889 ; 16.129,-1.651 16.891,-1.651 16.891,-0.889 16.129,-0.889 16.129,-1.651 ; 16.129,0.889 16.891,0.889 16.891,1.651 16.129,1.651 16.129,0.889 ; 18.669,-1.651 19.431,-1.651 19.431,-0.889 18.669,-0.889 18.669,-1.651 ; 18.669,0.889 19.431,0.889 19.431,1.651 18.669,1.651 18.669,0.889
  text "1" at -21.397,0.772 h1.2
  text "32" at 21.055,-1.925 h1.2
3D body "SAMTEC_ESW-116-69-L-D.stp": height 18.67, standoff -4.57, extent -20.574,-2.54 20.574,2.54